# Altium integrated library Sajad_Altium_Library.IntLib: 390 symbols (part 1 of 3) (continued)
## AT45db161 (continued)

## AT45DB321D
designator U?
32-megabit  2.7-volt  DataFlash; link: http://javanelec.com/productsDetails.aspx?id=3412
footprint SO8 - Big
pins: 1 SI (in), 2 SCK (in), 3 ~{RESET} (in), 4 ~{CS} (power), 5 ~{WP} (power), 6 VCC, 7 GND (power), 8 SO (power)

## ATmega8-16AC
designator U1
8-Bit AVR Microcontroller with 8K Bytes of In-System Programmable Flash Memory; Published: 17-Sep-2003; LatestRevisionDate: 13-Apr-2006; LatestRevisionNote: IPC-7351 Footprint Added.; DatasheetVersion: 2486H-AVR-09/02; PackageVersion: revB, Oct-2001; PackageReference: 32A; Publisher: Altium Limited; PackageDescription: 32-Pin Thin Quad Flat Pack 0.8 mm Pitch; Code_JEDEC: MS-026-ABA; ComponentLink1Description: Manufacturer Link; ComponentLink1URL: http://www.atmel.com; ComponentLink2Description: Datasheet; ComponentLink2URL: http://www.atmel.com/dyn/resources/prod_documents/doc2486.pdf
footprint LQFP32 (32-Pin Thin Quad Flat Pack 0.8 mm Pitch)
pins: 1 PD3 (INT1) (io), 2 PD4 (XCK/T0) (io), 3 GND (power), 4 VCC (power), 5 GND (power), 6 VCC (power), 7 PB6 (XTAL1/TOSC1) (io), 8 PB7 (XTAL2/TOSC2) (io), 9 PD5 (T1) (io), 10 PD6 (AIN0) (io), 11 PD7 (AIN1) (io), 12 PB0 (ICP) (io), 13 PB1 (OC1A) (io), 14 PB2 (~{SS}/OC1B) (io), 15 PB3 (MOSI/OC2) (io), 16 PB4 (MISO) (io), 17 PB5 (SCK) (io), 18 AVCC (power), 19 ADC6 (in), 20 AREF, 21 GND (power), 22 ADC7 (in), 23 PC0 (ADC0) (io), 24 PC1 (ADC1) (io), 25 PC2 (ADC2) (io), 26 PC3 (ADC3) (io), 27 PC4 (ADC4/SDA) (io), 28 PC5 (ADC5/SCL) (io), 29 PC6 (~{RESET}) (io), 30 PD0 (RXD) (io), 31 PD1 (TXD) (io), 32 PD2 (INT0) (io)

## ATmega32-16AC
designator U?
8-Bit AVR Microcontroller with 32K Bytes of In-System Programmable Flash Memory; Published: 17-Sep-2003; LatestRevisionDate: 13-Apr-2006; LatestRevisionNote: IPC-7351 Footprint Added.; DatasheetVersion: 2503C-AVR-10/02; PackageVersion: rev.B, Oct-2001; PackageReference: 44A; Publisher: Altium Limited; PackageDescription: 44-Pin Thin Quad Flat Pack 0.8 mm Pitch; ComponentLink1Description: Manufacturer Link; ComponentLink1URL: http://www.atmel.com; ComponentLink2Description: Datasheet; ComponentLink2URL: http://www.atmel.com/dyn/resources/prod_documents/doc2503.pdf
footprint LQFP44 (Thin QFP, 44-Leads, Body 10x10mm, Pitch 0.8mm, IPC Medium Density)
pins: 1 PB5 (MOSI) (io), 2 PB6 (MISO) (io), 3 PB7 (SCK) (io), 4 ~{RESET} (in), 5 VCC (power), 6 GND (power), 7 XTAL2, 8 XTAL1, 9 PD0 (RXD) (io), 10 PD1 (TXD) (io), 11 PD2 (INT0) (io), 12 PD3 (INT1) (io), 13 PD4 (OC1B) (io), 14 PD5 (OC1A) (io), 15 PD6 (ICP) (io), 16 PD7 (OC2) (io), 17 VCC (power), 18 GND (power), 19 PC0 (SCL) (io), 20 PC1 (SDA) (io), 21 PC2 (TCK) (io), 22 PC3 (TMS) (io), 23 PC4 (TDO) (io), 24 PC5 (TDI) (io), 25 PC6 (TOSC1) (io), 26 PC7 (TOSC2) (io), 27 AVCC (power), 28 GND (power), 29 AREF, 30 PA7 (ADC7) (io), 31 PA6 (ADC6) (io), 32 PA5 (ADC5) (io), 33 PA4 (ADC4) (io), 34 PA3 (ADC3) (io), 35 PA2 (ADC2) (io), 36 PA1 (ADC1) (io), 37 PA0 (ADC0) (io), 38 VCC (power), 39 GND (power), 40 PB0 (XCK/T0) (io), 41 PB1 (T1) (io), 42 PB2 (AIN0/INT2) (io), 43 PB3 (AIN1/OC0) (io), 44 PB4 (~{SS}) (io)

## ATmega64
designator U?  (value not drawn)
8-Bit AVR; Published: 17-Sep-2003; LatestRevisionDate: 13-Apr-2006; LatestRevisionNote: IPC-7351 Footprint Added.; DatasheetVersion: 2490C-AVR-009/02; PackageVersion: revB, Oct-2001; PackageReference: 64A; Publisher: Altium Limited; PackageDescription: 64-Pin Thin Quad Flat Pack 0.8 mm Pitch; Code_JEDEC: MS-026-AEB; ComponentLink1Description: Manufacturer Link; ComponentLink1URL: http://www.atmel.com; ComponentLink2Description: Datasheet; ComponentLink2URL: http://www.atmel.com/dyn/resources/prod_documents/doc2490.pdf
footprint LQFP 64 (64-Pin Thin Quad Flat Pack 0.8 mm Pitch)
pins: 1 ~{PEN} (in), 2 PE0 RXD0/(PDI) (io), 3 PE1 (TXD0/PDO) (io), 4 PE2 (XCK0/AIN0) (io), 5 PE3 (OC3A/AIN1) (io), 6 PE4 (OC3B/INT4) (io), 7 PE5 (OC3C/INT5) (io), 8 PE6 (T3/INT6) (io), 9 PE7 (IC3/INT7) (io), 10 PB0 (~{SS}) (io), 11 PB1 (SCK) (io), 12 PB2 (MOSI) (io), 13 PB3 (MISO) (io), 14 PB4 (OC0) (io), 15 PB5 (OC1A) (io), 16 PB6 (OC1B) (io), 17 PB7 (OC2/OC1C) (io), 18 PG3/TOSC2 (io), 19 PG4/TOSC1 (io), 20 ~{RESET} (in), 21 VCC (power), 22 GND (power), 23 XTAL2, 24 XTAL1, 25 PD0 (SCL/INT0) (io), 26 PD1 (SDA/INT1) (io), 27 PD2 (RXD1/INT2) (io), 28 PD3 (TXD1/INT3) (io), 29 PD4 (IC1) (io), 30 PD5 (XCK1) (io), 31 PD6 (T1) (io), 32 PD7 (T2) (io), 33 PG0 (~{WR}) (io), 34 PG1 (~{RD}) (io), 35 PC0 (A8) (io), 36 PC1 (A9) (io), 37 PC2 (A10 (io), 38 PC3 (A11) (io), 39 PC4 (A12) (io), 40 PC5 (A13) (io), 41 PC6 (A14) (io), 42 PC7 (A15) (io), 43 PG2 (ALE) (io), 44 PA7 (AD7) (io), 45 PA6 (AD6) (io), 46 PA5 (AD5) (io), 47 PA4 (AD4) (io), 48 PA3 (AD3) (io), 49 PA2 (AD2) (io), 50 PA1 (AD1) (io), 51 PA0 (AD0) (io), 52 VCC (power), 53 GND (power), 54 PF7 (ADC7/TDI) (io), 55 PF6 (ADC6/TDO) (io), 56 PF5 (ADC5/TMS) (io), 57 PF4 (ADC4/TCK) (io), 58 PF3 (ADC3) (io), 59 PF2 (ADC2) (io), 60 PF1 (ADC1) (io), 61 PF0 (ADC0) (io), 62 AREF, 63 GND (power), 64 AVCC (power)

## ATX_2x2
designator ATX?, comment Atx connector
ATX 2x2 RIGHT ANGLE
footprint ATX 2X2 RIGHT ANGLE
pins: 1 (power), 2 (power), 3 (power), 4 (power)
1 alternate drawing of the same symbol

## ATX_4x2
designator ATX?, comment Servo Motor
ATX 4X2 CONNECTOR
footprint ATX 4X2 RIGHT ANGLE
pins: 1 (power), 2 (power), 3 (power), 4 (power), 5 (power), 6 (power), 7 (power), 8 (power)

## ATX_7x2
designator ATX?, comment Servo Motor
ATX 7X2 CONNECTOR
footprint ATX 7X2 RIGHT ANGLE
pins: 1 (power), 2 (power), 3 (power), 4 (power), 5 (power), 6 (power), 7 (power), 8 (power), 9 (power), 10 (power), 11 (power), 12 (power), 13 (power), 14 (power)

## Battery_RTC
designator Bat_3.3V
footprint Backup_Bat
pins: 1 P, 2 N

## BatteryOnBorad
designator Bat?
footprint BATTERYONBORAD1
footprint BATTERYONBORAD2
footprint Backup_Bat
pins: 1 B+ (power), 2 Gnd (power)

## BAV70W
designator D?
Silicon Switching Diode Array with Common Cathode for High-Speed Switching; Published: 21-Mar-2003; DatasheetDocument: Oct-1999; PackageDocument: Sep-2001; PackageReference: SOT-323; Publisher: Altium Limited; ComponentLink1Description: Manufacturer Link; ComponentLink1URL: http://www.infineon.com/
footprint BAV70
pins: 1 A1, 2 A2, 3 K

## BC327
designator Q?
Amplifier Transistor PNP Silicon; Published: 29-Sep-2000; LatestRevisionDate: 17-Jul-2002; LatestRevisionNote: Re-released for DXP Platform.; DatasheetVersion: 1996; PackageVersion: 1996; PackageReference: 29-04; Publisher: Altium Limited; PackageDescription: TO, Flat Index; 3 In-Line, Axial Leads; Body Dia. 4.8mm; Leads 0.48 x 0.5 mm (max); ComponentLink1Description: Manufacturer Link; ComponentLink1URL: http://www.onsemi.com/site/products/landing?taxonomyID=194; ComponentLink2Description: Datasheet; ComponentLink2URL: http://www.onsemi.com/pub/Collateral/BC327-D.PDF
footprint SOT95P230-3M (SOT23, 3-Leads, Body 2.9x1.3mm, Pitch 0.95mm, Lead Span 2.3mm - Alternate Lead Configuration, IPC Low Density)
pins: 1 C, 2 B, 3 E

## BC807
designator Q?
45 V, 500 mA PNP general-purpose transistors; Published: 29-Sep-2000; LatestRevisionDate: 17-Jul-2002; LatestRevisionNote: Re-released for DXP Platform.; DatasheetVersion: 1996; PackageVersion: 1996; PackageReference: 29-04; Publisher: Altium Limited; PackageDescription: TO, Flat Index; 3 In-Line, Axial Leads; Body Dia. 4.8mm; Leads 0.48 x 0.5 mm (max); ComponentLink1Description: Manufacturer Link; ComponentLink1URL: http://www.onsemi.com/site/products/landing?taxonomyID=194; ComponentLink2Description: Datasheet; ComponentLink2URL: http://www.onsemi.com/pub/Collateral/BC327-D.PDF
footprint SOT23
footprint SOT23_
pins: 1 B, 2 E, 3 C

## BC817-16
designator Q?, comment BC817
NPN General-purpose Transistor; Published: 17-Sep-2003; LatestRevisionDate: 12-Dec-2006; LatestRevisionNote: IPC-7351 Footprint Added.; DatasheetVersion: Jun-1999; PackageVersion: May-1999; PackageReference: SOT23; Publisher: Altium Limited; PackageDescription: 3-Pin SOT-23 Package 0.95 mm Pitch, 2.3 mm Lead Span; ComponentLink1Description: Manufacturer Link; ComponentLink1URL: http://www.semiconductors.philips.com/; ComponentLink2Description: Datasheet; ComponentLink2URL: http://www.semiconductors.philips.com/acrobat/datasheets/BC817_BC817W_BC337_5.pdf
footprint SOT23
footprint SOT23_
pins: 1 B, 2 E, 3 C

## BC846
designator Q?, comment BC846A
Transistor_NPN General Purpose Amplifier
footprint BC846
pins: 1 B, 2 C, 3 E

## BCP56T1
designator Q?
1A MEDIUM POWER NPN SILICON  HIGH CURRENT TRANSISTOR; Link: http://javanelec.com/productsDetails.aspx?id=18757
footprint SOT223
pins: 1 B, 2 C, 3 E, 4 C

## BNC
designator J?
BNC Connector
footprint AMP31-5540
footprint AMP31-203
footprint BNC_RA CON (Connector; BNC Elbow)
pins: 1 SIGNAL, 2 SHIELD

## BS813A-1
designator U?
Touch Key 3 Touch Key; Link: http://javanelec.com/Shops/ProductDetail/538?part_number=BS813A-1
footprint SO8
pins: 1 KEY1, 2 KEY2, 3 KEY3, 4 KOUT3 (power), 5 KOUT2 (power), 6 KOUT1 (power), 7 VSS (power), 8 VDD (power)

## BS818A-2
designator U?
Touch Key 8 Touch Key Driver; Link: http://javanelec.com/Shops/ProductDetail/13231?part_number=BS818A-2
footprint SO16
pins: 1 KEY1, 2 KEY2, 3 KEY3, 4 KEY4, 5 KEY5, 6 KEY6, 7 KEY7, 8 KEY8, 9 VSS (power), 10 VDD (power), 11 LSC (power), 12 OMS (power), 13 BIN0 (power), 14 BIN1 (power), 15 BIN2/Clk (power), 16 BIN3/Data (power)

## Button3Pin
designator B?, comment Button  (value not drawn)
Button3pin
footprint Button3Pin
pins: 1 NO, 2 Com, 3 NC, 4 Ch

## Buzzer
designator BZ?
Buzzer 6v to 24 v
footprint Buzzer_Big (Buzzer 6v to 24v)
footprint Buzzer_Small (Buzzer 6v to 24v)
footprint Buzzer
footprint Buzzer_Small_Right (Buzzer 6v to 24v)
pins: 1 + (power), 2 - (power)

## Cap
designator C?, comment 100nF
Capacitor; Published: 8-Jun-2000; LatestRevisionDate: 17-Jul-2002; LatestRevisionNote: Re-released for DXP Platform.; PackageReference: RAD-0.3; Publisher: Altium Limited
footprint 1206 -cap
footprint 0805 - big
footprint 0603-Cap
footprint 0805 - Cap
footprint AXIAL -0.4 Varistor (Axial Device, Thru-Hole; 2 Leads; 0.4 in Pin Spacing)
footprint VP32-3.2 (Capacitor, Ceramic, Thru-Hole, Dipped Radial; Body 5.1 x 3.2 mm (WxT) Pin Spacing 2.54 mm (typ))
footprint 0603-Cap -sm
footprint 0805_MediumCap
pins: 1, 2

## Capacitor
designator C?, comment Electrolyte Capacitor
footprint Cap 4700uf 50v
footprint cap 100uf 25v
footprint cap 10uf 50v
footprint cap 220uf 16v
footprint Cap 2200uf 25v
footprint cap 470uf 25v
footprint Cap 2200uf 50v
footprint 100U_SMD
footprint CAP 220UF 25V (cap 220uf 25v)
footprint Cap 5 x 5.5 (5 x 5.5mm Smd Capacitor)
footprint Cap 5.3 x 6.3 (5.3 x 6.3 mm Smd Capacitor)
footprint 3528 (Tantalum Capacitor Case B)
footprint SMD_1000uf 16V
footprint SMD_Cap_10x10
footprint CAP_TAN_D
pins: 1, 2
text: +

## Cash_Connector
designator Cash?, comment RJ-12 Connector
LatestRevisionDate: 17-Jul-2002; LatestRevisionNote: Re-released for DXP Platform.; Publisher: Altium Limited
footprint JACK1.27-2H6 (Connector; PCB Jack, Thru-Hole; 1-Port, 6 Positions, 6 Loaded; Unshielded without Lightpipes; Right Angle)
pins: 1, 2, 3, 4, 5, 6, 7

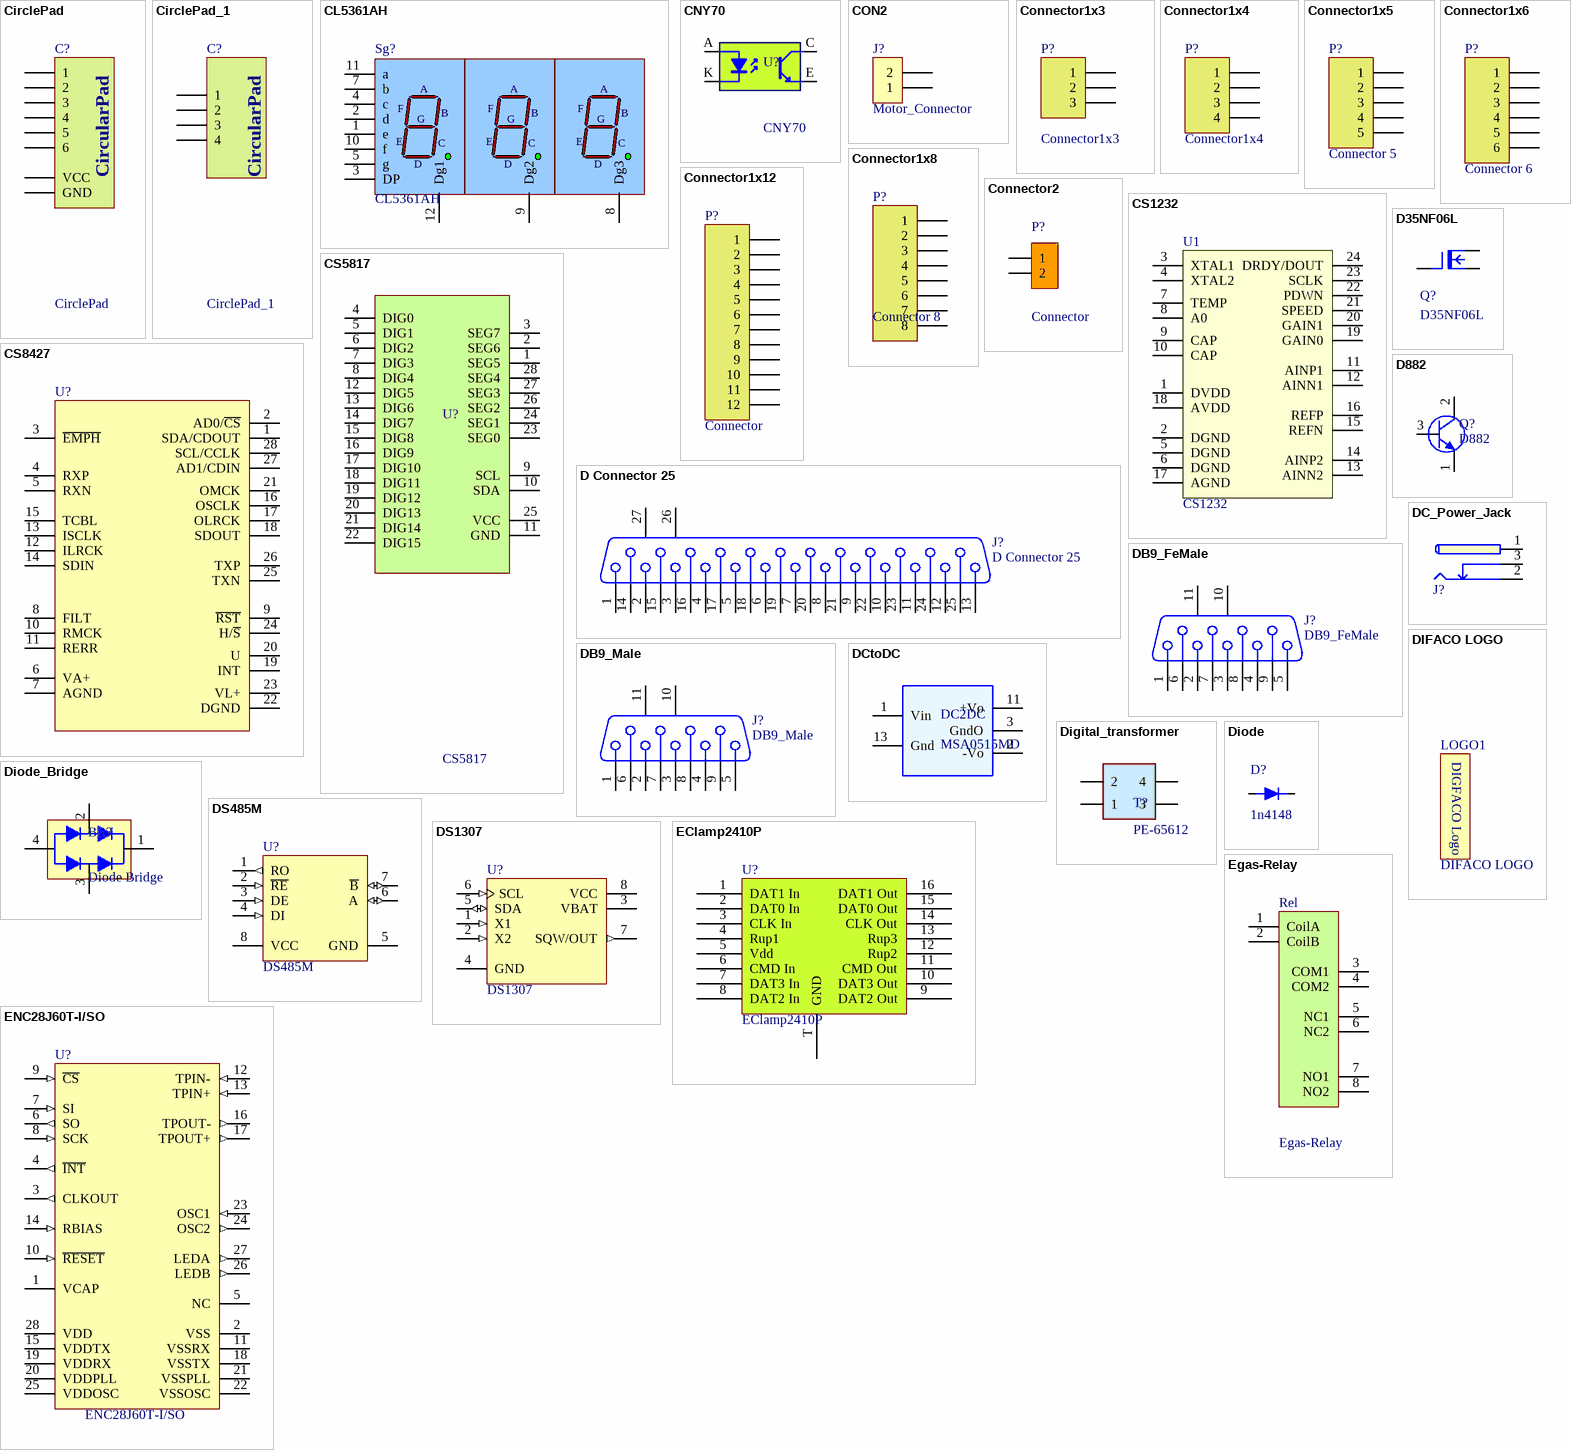
[diagram p2: symbols CirclePad to ENC28J60T-I/SO]

## CirclePad
designator C?
For Mirror Control
footprint MirrorJoystick (Dena & Samand Car)
pins: 1, 2, 3, 4, 5, 6, GND, VCC
text: CircularPad

## CirclePad_1
designator C?
For Mirror Control
footprint CirclePad
pins: 1, 2, 3, 4
text: CircularPad

## CL5361AH
designator Sg?
3 Digit 7-Segment Display: CC, Red
footprint 3Digit 7SEGMENT
pins: 1 e "Cathode", 2 d "Cathode", 3 DP "Cathode", 4 c "Cathode", 5 g "Cathode", 7 b "Cathode", 8 Dg3 "Anode", 9 Dg2 "Anode", 10 f "Cathode", 11 a "Cathode", 12 Dg1 "Anode"
text: A; F; B; G; E; C; D

## CNY70
designator U?
Reflective Optical Sensor with Transistor Output
footprint CNY70
pins: A "Anode", C "Collector", E "Emitter", K "Cathode"

## CON2
designator J?, comment Motor_Connector
Connector
footprint MOTOR_CON_ATP
footprint MOTOR_CON2 (AtpMotor)
pins: 1, 2

## Connector1x3
designator P?
Header, 3-Pin,2.5mm; LatestRevisionDate: 17-Jul-2002; LatestRevisionNote: Re-released for DXP Platform.; Publisher: Altium Limited
footprint Connector1x3 (Connector; Header; 3 Position)
pins: 1, 2, 3

## Connector1x4
designator P?
Header, 4-Pin,2.5mm; LatestRevisionDate: 17-Jul-2002; LatestRevisionNote: Re-released for DXP Platform.; Publisher: Altium Limited
footprint Connector1x4 (Connector; Header; 4 Position)
pins: 1, 2, 3, 4

## Connector1x5
designator P?, comment Connector 5
Connector, 5-Pin2.5mm; LatestRevisionDate: 17-Jul-2002; LatestRevisionNote: Re-released for DXP Platform.; Publisher: Altium Limited
footprint Connector1X5 (Connector; Header; 5 Position)
pins: 1, 2, 3, 4, 5

## Connector1x6
designator P?, comment Connector 6
Connector, 6-Pin2.5mm; LatestRevisionDate: 17-Jul-2002; LatestRevisionNote: Re-released for DXP Platform.; Publisher: Altium Limited
footprint Connector1X6 (Connector; Header; 6 Position)
pins: 1, 2, 3, 4, 5, 6

## Connector1x8
designator P?, comment Connector 8
Connector, 8-Pin2.5mm; LatestRevisionDate: 17-Jul-2002; LatestRevisionNote: Re-released for DXP Platform.; Publisher: Altium Limited
footprint CONNECTOR1X8 (Connector; Header; 8 Position)
pins: 1, 2, 3, 4, 5, 6, 7, 8

## Connector1x12
designator P?, comment Connector
Connector 12-Pin 2.5mm; LatestRevisionDate: 17-Jul-2002; LatestRevisionNote: Re-released for DXP Platform.; Publisher: Altium Limited
footprint Connector1X12 (Connector 1x12)
pins: 1, 2, 3, 4, 5, 6, 7, 8, 9, 10, 11, 12

## Connector2
designator P?, comment Connector
Connector 2pin 2.5mm
footprint Connector1X2 (Connector;  2.5 mm)
pins: 1, 2

## CS1232
designator U1
Ultra Low-Noise, 24-Bit Analog-to-Digital Converter
footprint TSSOP 24 (SSOP, Plastic; 24 Leads; Body Width 5.3 mm; Pitch 0.65 mm)
pins: 1 DVDD, 2 DGND, 3 XTAL1, 4 XTAL2, 5 DGND, 6 DGND, 7 TEMP, 8 A0, 9 CAP, 10 CAP, 11 AINP1, 12 AINN1, 13 AINN2, 14 AINP2, 15 REFN, 16 REFP, 17 AGND, 18 AVDD, 19 GAIN0, 20 GAIN1, 21 SPEED, 22 PDWN, 23 SCLK, 24 DRDY/DOUT

## CS5817
designator U?
LED display driver with 8 SEG× 16 DIG
footprint SOP28 (SOP28, 28-Leads)
footprint SDIP-28 (DIP, Plastic, 28-Pin, Row Spacing 10.16 mm, Pitch 1.778 mm)
pins: 1 SEG5, 2 SEG6, 3 SEG7, 4 DIG0, 5 DIG1, 6 DIG2, 7 DIG3, 8 DIG4, 9 SCL, 10 SDA, 11 GND, 12 DIG5, 13 DIG6, 14 DIG7, 15 DIG8, 16 DIG9, 17 DIG10, 18 DIG11, 19 DIG12, 20 DIG13, 21 DIG14, 22 DIG15, 23 SEG0, 24 SEG1, 25 VCC, 26 SEG2, 27 SEG3, 28 SEG4

## CS8427
designator U?  (value not drawn)
96 kHz Digital Audio Interface Transceiver
footprint TSSOP28 (TSOP, 28-Leads, Body 9.7x4.4mm, Pitch 0.65mm, IPC Low Density)
pins: 1 SDA/CDOUT, 2 AD0/~{CS}, 3 ~{EMPH}, 4 RXP, 5 RXN, 6 VA+, 7 AGND, 8 FILT, 9 ~{RST}, 10 RMCK, 11 RERR, 12 ILRCK, 13 ISCLK, 14 SDIN, 15 TCBL, 16 OSCLK, 17 OLRCK, 18 SDOUT, 19 INT, 20 U, 21 OMCK, 22 DGND, 23 VL+, 24 H/~{S}, 25 TXN, 26 TXP, 27 AD1/CDIN, 28 SCL/CCLK

## D35NF06L
designator Q?
Mosfet
footprint TO-252; pin to pad 2>4
pins: 1 G, 2 D, 3 S

## D882
designator Q?
NPN medium power transistor 3A; Published: 17-Sep-2003; LatestRevisionDate: 12-Dec-2006; LatestRevisionNote: IPC-7351 Footprint Added.; DatasheetVersion: Jun-1999; PackageVersion: May-1999; PackageReference: SOT23; Publisher: Altium Limited; PackageDescription: 3-Pin SOT-23 Package 0.95 mm Pitch, 2.3 mm Lead Span; ComponentLink1Description: Manufacturer Link; ComponentLink1URL: http://www.semiconductors.philips.com/; ComponentLink2Description: Datasheet; ComponentLink2URL: http://www.semiconductors.philips.com/acrobat/datasheets/BC817_BC817W_BC337_5.pdf
footprint SOT32 (TO -126) (SIP with Mounting Hole; 3 Leads; Body 10.7 x 7.6 x 2.6 mm (typ); Pitch 2.2 mm)
pins: 1 E, 2 C, 3 B

## D Connector 25
designator J?
Receptacle Assembly, 25 Position, Right Angle; PackageDocument: U; Positions: 25; Published: 15-Jun-2001; LatestRevisionDate: 17-Jul-2002; LatestRevisionNote: Re-released for DXP Platform.; DatasheetDocument: 19-Mar-1999; PackageReference: 787202; Publisher: Altium Limited; Orientation: Right Angle; Gender: Receptacle
footprint DB25_male (Connector; D Subminiature; 25 Position; Right Angle; Pitch 1.385 mm)
footprint DB25_female (Connector; D Subminiature; 25 Position; Right Angle; Pitch 1.385 mm)
pins: 1, 2, 3, 4, 5, 6, 7, 8, 9, 10, 11, 12, 13, 14, 15, 16, 17, 18, 19, 20, 21, 22, 23, 24, 25, 26 MH1, 27 MH2

## DB9_FeMale
designator J?
Receptacle Assembly, 9 Position, Right Angle; PackageDocument: O; Positions: 9; Published: 15-Jun-2001; LatestRevisionDate: 17-Jul-2002; LatestRevisionNote: Re-released for DXP Platform.; DatasheetDocument: 1-Sep-1999; PackageReference: 788750; Publisher: Altium Limited; Orientation: Right Angle; Gender: Receptacle
footprint DB9Female (DB9 Serial Connector)
pins: 1, 2, 3, 4, 5, 6, 7, 8, 9, 10 MH1, 11 MH2

## DB9_Male
designator J?
Receptacle Assembly, 9 Position, Right Angle; PackageDocument: O; Positions: 9; Published: 15-Jun-2001; LatestRevisionDate: 17-Jul-2002; LatestRevisionNote: Re-released for DXP Platform.; DatasheetDocument: 1-Sep-1999; PackageReference: 788750; Publisher: Altium Limited; Orientation: Right Angle; Gender: Receptacle
footprint DB9Male (DB9 Serial Connector)
pins: 1, 2, 3, 4, 5, 6, 7, 8, 9, 10 MH1, 11 MH2

## DC_Power_Jack
designator J?, comment DC Power Jack  (value not drawn)
footprint DC_Power_Jack
pins: 1 V+ (power), 2 GND (power), 3 GND1 (power)
2 alternate drawings of the same symbol

## DCtoDC
designator DC2DC, comment MSA0515MD
dc to dc 4.5-9 volt in +-15 volt out
footprint DC_DC (dc to dc footprint); pin to pad 1>1+24 2>2+23 3>3+22+10+15 11>11+14 13>12+13
pins: 1 Vin, 2 -Vo, 3 GndO, 11 +Vo, 13 Gnd

## DIFACO LOGO
designator LOGO1
Designer: OMIGA
footprint LOGO_DIFACO
text: DIGFACO Logo

## Digital_transformer
designator T?, comment PE-65612
TRANSFORMERS FOR DIGITAL  AUDIO DATA TRANSMISSION; Code_IEC: 1005; Published: 8-Jun-2000; LatestRevisionDate: 17-Jul-2002; LatestRevisionNote: Re-released for DXP Platform.; PackageReference: 0402-A; Publisher: Altium Limited; Code_JEITA: 0402
footprint PE-65612 (TRANSFORMERS FOR DIGITAL  AUDIO DATA TRANSMISSION)
pins: 1, 2, 3, 4

## Diode
designator D?, comment 1n4148
footprint DO-214AC (1N4001-7 SMD DIODE)
footprint mini melf (1n4148 smd)
footprint SOD123 (Sod123)
pins: 1 A, 2 K

## Diode_Bridge
designator BR?, comment Diode Bridge
footprint Bridge_KBP204 (KBP204 Diode Bridge)
footprint Bridge_RS202 (RS202 Diode Bridge)
footprint Bridge_W10M (W10M Diode Bridge)
pins: 1, 2, 3, 4

## DS485M
designator U?
Low-Power RS-485/RS-422 Multipoint Transceiver, 8-pin Narrow SOIC; Manufacturer: National Semiconductor; PackageTopMarking: NSZXTT*DS485*M; PowerWise: N; CompType: Interface IC; Published: 4-Dec-2008; DatasheetVersion: Jul-1998; PackageVersion: revM, May-2009; PackageReference: M08A; Publisher: Altium Limited; PackageDescription: SOIC Narrow, 4.9 x 3.9 x 1.45mm, 8 Lead, 1.27mm Pitch; Supplier 1: Farnell; Supplier Part Number 1: 9490078; PartNumber: DS485M; RoHS: N; PinCount: 8; Code_JEDEC: MS-012-AA; Code_IPC: SOIC127P600-8; ComponentLink1Description: DS485 Datasheet; ComponentLink1URL: http://www.national.com/ds/DS/DS485.pdf; ComponentLink2Description: DS485 Web Page; ComponentLink2URL: http://www.national.com/pf/DS/DS485.html; ComponentLink3Description: M08A Package Page; ComponentLink3URL: http://www.national.com/packaging/folders/m08a.html
footprint SO8
pins: 1 RO (out), 2 ~{RE} (in), 3 DE (in), 4 DI (in), 5 GND (power), 6 A (io), 7 ~{B} (io), 8 VCC (power)

## DS1307
designator U?
64 X 8 Serial Real-Time Clock; Published: 13-Oct-2000; LatestRevisionDate: 06-Jun-2005; LatestRevisionNote: Stylized 3D Model Added.; DatasheetVersion: 10-Aug-1999; PackageVersion: 1999; PackageReference: DIP8; Publisher: Altium Limited; PackageDescription: DIP; 8 Leads; Row Spacing 7.62 mm; Pitch 2.54 mm; ComponentLink1Description: Manufacturer Link; ComponentLink1URL: http://www.maxim-ic.com/; ComponentLink2Description: Datasheet; ComponentLink2URL: http://pdfserv.maxim-ic.com/en/ds/DS1307.pdf; ComponentLink3Description: Discontinuation Notice; ComponentLink3URL: http://www.maxim-ic.com/qa/pdfs/non-obsolescence-letter.pdf
footprint SO8
pins: 1 X1 (in), 2 X2 (in), 3 VBAT (power), 4 GND (power), 5 SDA (io), 6 SCL (in), 7 SQW/OUT (out), 8 VCC (power)

## EClamp2410P
designator U?
ESD Protection Device   for T-Flash/MicroSD Interfaces
footprint SLP4016P16 (EClamp2410P  ESD Protection Device   for T-Flash/MicroSD Interfaces)
pins: 1 DAT1 In, 2 DAT0 In, 3 CLK In, 4 Rup1, 5 Vdd, 6 CMD In, 7 DAT3 In, 8 DAT2 In, 9 DAT2 Out, 10 DAT3 Out, 11 CMD Out, 12 Rup2, 13 Rup3, 14 CLK Out, 15 DAT0 Out, 16 DAT1 Out, T GND

## Egas-Relay
designator Rel
footprint Rel_Egas1
pins: 1 CoilA, 2 CoilB, 3 COM1 "Out", 4 COM2, 5 NC1, 6 NC2, 7 NO1, 8 NO2

## ENC28J60T-I/SO
designator U?
Stand-Alone Ethernet Controller with SPI Interface, 28-Pin SOIC, Industrial Temperature, Tape and Reel; FirstPublished: 29-Jan-2009; DatasheetVersion: RevC, Jan-2008; PackageVersion: revBB, Aug-2009; PackageReference: SOIC-SO28; Publisher: Altium Limited; PackageDescription: 28-Lead Plastic Small Outline (SO) - Wide 7.50mm Body [SOIC]; Supplier 1: Digi-Key; Supplier Part Number 1: ENC28J60T-I/SO-ND; Supplier 2: Newark; Supplier Part Number 2: 07P9118; Code_JEDEC: MS-013; ComponentLink1Description: Datasheet; ComponentLink1URL: http://ww1.microchip.com/downloads/en/DeviceDoc/39662c.pdf; ComponentLink2Description: Packaging Specification; ComponentLink2URL: http://www.microchip.com/stellent/groups/techpub_sg/documents/packagingspec/en012702.pdf; ComponentLink3Description: Microchip.com Home; ComponentLink3URL: http://www.microchip.com/
footprint SOP28 (SOP28, 28-Leads)
pins: 1 VCAP (power), 2 VSS (power), 3 CLKOUT (out), 4 ~{INT} (out), 5 NC, 6 SO (out), 7 SI (in), 8 SCK (in), 9 ~{CS} (in), 10 ~{RESET} (in), 11 VSSRX (power), 12 TPIN- (in), 13 TPIN+ (in), 14 RBIAS (in), 15 VDDTX (power), 16 TPOUT- (out), 17 TPOUT+ (out), 18 VSSTX (power), 19 VDDRX (power), 20 VDDPLL (power), 21 VSSPLL (power), 22 VSSOSC (power), 23 OSC1 (in), 24 OSC2 (out), 25 VDDOSC (power), 26 LEDB (out), 27 LEDA (out), 28 VDD (power)